# Altium schematic symbol library jlcpcb_2025_04_capacitors_extended_0603.schlib: 3668 symbols (part 5 of 20) (continued)
## 0603X225K250NT
designator C?  Capacitance: 2.2uF  (hidden comment: *)
Capacitor, Ceramic (MLCC), 2.2uF, ±10%, 25V, X5R, ±10%, SMD 0603; Manufacturer: FH(Guangdong Fenghua Advanced Tech); Manufacturer Part Number: 0603X225K250NT; Package Size: 0603; JLCPCB Basic Part: No; JLCPCB Part Number: C99227; Supplier 1: LCSC; Category: Capacitors - MLCC; Supplier Part Number 1: C99227; Tolerance: ±10%; Voltage Rating: 25V; Temperature Coefficient: X5R; RoHS: Yes; ComponentLink1Description: Datasheet; ComponentLink1URL: https://wmsc.lcsc.com/wmsc/upload/file/pdf/v2/lcsc/2304140030_FH--Guangdong-Fenghua-Advanced-Tech-0603X225K250NT_C99227.pdf; ComponentLink2Description: JLCPCB Part URL; ComponentLink2URL: https://jlcpcb.com/partdetail/C99227; ComponentLink3Description: LCSC Part URL; ComponentLink3URL: https://lcsc.com/product-detail/Multilayer-Ceramic-Capacitors-MLCC---SMD-SMT_FH-Guangdong-Fenghua-Advanced-Tech-FH-Guangdong-Fenghua-Advanced-Tech-0603X225K250NT_C99227.html
footprint CAP-0603 (0603 (1608M) Capacitor)
pins: 1, 2

## 0603X225K500CT
designator C?  Capacitance: 2.2uF  (hidden comment: *)
Capacitor, Ceramic (MLCC), 2.2uF, ±10%, 50V, X5R, ±10%, SMD 0603; Manufacturer: Walsin Tech Corp; Manufacturer Part Number: 0603X225K500CT; Package Size: 0603; JLCPCB Basic Part: No; JLCPCB Part Number: C3853330; Supplier 1: LCSC; Category: Capacitors - MLCC; Supplier Part Number 1: C3853330; Tolerance: ±10%; Voltage Rating: 50V; Temperature Coefficient: X5R; RoHS: Yes; ComponentLink1Description: Datasheet; ComponentLink1URL: https://wmsc.lcsc.com/wmsc/upload/file/pdf/v2/lcsc/2309201536_Walsin-Tech-Corp-0603X225K500CT_C3853330.pdf; ComponentLink2Description: JLCPCB Part URL; ComponentLink2URL: https://jlcpcb.com/partdetail/C3853330; ComponentLink3Description: LCSC Part URL; ComponentLink3URL: https://lcsc.com/product-detail/Multilayer-Ceramic-Capacitors-MLCC---SMD-SMT_Walsin-Tech-Corp-Walsin-Tech-Corp-0603X225K500CT_C3853330.html
footprint CAP-0603 (0603 (1608M) Capacitor)
pins: 1, 2

## 0603X225M6R3CT
designator C?  Capacitance: 2.2uF  (hidden comment: *)
Capacitor, Ceramic (MLCC), 2.2uF, ±20%, 6.3V, X5R, ±20%, SMD 0603; Manufacturer: Walsin Tech Corp; Manufacturer Part Number: 0603X225M6R3CT; Package Size: 0603; JLCPCB Basic Part: No; JLCPCB Part Number: C458915; Supplier 1: LCSC; Category: Capacitors - MLCC; Supplier Part Number 1: C458915; Tolerance: ±20%; Voltage Rating: 6.3V; Temperature Coefficient: X5R; RoHS: Yes; ComponentLink1Description: Datasheet; ComponentLink1URL: https://wmsc.lcsc.com/wmsc/upload/file/pdf/v2/lcsc/2304140030_Walsin-Tech-Corp-0603X225M6R3CT_C458915.pdf; ComponentLink2Description: JLCPCB Part URL; ComponentLink2URL: https://jlcpcb.com/partdetail/C458915; ComponentLink3Description: LCSC Part URL; ComponentLink3URL: https://lcsc.com/product-detail/Multilayer-Ceramic-Capacitors-MLCC---SMD-SMT_Walsin-Tech-Corp-Walsin-Tech-Corp-0603X225M6R3CT_C458915.html
footprint CAP-0603 (0603 (1608M) Capacitor)
pins: 1, 2

## 0603X225M100NT
designator C?  Capacitance: 2200000pF  (hidden comment: *)
Capacitor, Ceramic (MLCC), 2200000pF, ±20%, 10V, X5R, ±20%, SMD 0603; Manufacturer: FH (Guangdong Fenghua Advanced Tech); Manufacturer Part Number: 0603X225M100NT; Package Size: 0603; JLCPCB Basic Part: No; JLCPCB Part Number: C2857986; Supplier 1: LCSC; Category: Capacitors - MLCC; Supplier Part Number 1: C2857986; Tolerance: ±20%; Voltage Rating: 10V; Temperature Coefficient: X5R; RoHS: Yes; ComponentLink1Description: Datasheet; ComponentLink2Description: JLCPCB Part URL; ComponentLink2URL: https://jlcpcb.com/partdetail/C2857986; ComponentLink3Description: LCSC Part URL; ComponentLink3URL: https://lcsc.com/product-detail/Multilayer-Ceramic-Capacitors-MLCC---SMD-SMT_FH-Guangdong-Fenghua-Advanced-Tech-FH-Guangdong-Fenghua-Advanced-Tech-0603X225M100NT_C2857986.html
footprint CAP-0603 (0603 (1608M) Capacitor)
pins: 1, 2

## 0603X226M6R3CT
designator C?  Capacitance: 22uF  (hidden comment: *)
Capacitor, Ceramic (MLCC), 22uF, ±20%, 6.3V, X5R, ±20%, SMD 0603; Manufacturer: Walsin Tech Corp; Manufacturer Part Number: 0603X226M6R3CT; Package Size: 0603; JLCPCB Basic Part: No; JLCPCB Part Number: C93926; Supplier 1: LCSC; Category: Capacitors - MLCC; Supplier Part Number 1: C93926; Tolerance: ±20%; Voltage Rating: 6.3V; Temperature Coefficient: X5R; RoHS: Yes; ComponentLink1Description: Datasheet; ComponentLink1URL: https://wmsc.lcsc.com/wmsc/upload/file/pdf/v2/lcsc/2304140030_Walsin-Tech-Corp-0603X226M6R3CT_C93926.pdf; ComponentLink2Description: JLCPCB Part URL; ComponentLink2URL: https://jlcpcb.com/partdetail/C93926; ComponentLink3Description: LCSC Part URL; ComponentLink3URL: https://lcsc.com/product-detail/Multilayer-Ceramic-Capacitors-MLCC---SMD-SMT_Walsin-Tech-Corp-Walsin-Tech-Corp-0603X226M6R3CT_C93926.html
footprint CAP-0603 (0603 (1608M) Capacitor)
pins: 1, 2

## 0603X226M6R3NT
designator C?  Capacitance: 22uF  (hidden comment: *)
Capacitor, Ceramic (MLCC), 22uF, ±20%, 6.3V, X5R, ±20%, SMD 0603; Manufacturer: FH(Guangdong Fenghua Advanced Tech); Manufacturer Part Number: 0603X226M6R3NT; Package Size: 0603; JLCPCB Basic Part: No; JLCPCB Part Number: C94018; Supplier 1: LCSC; Category: Capacitors - MLCC; Supplier Part Number 1: C94018; Tolerance: ±20%; Voltage Rating: 6.3V; Temperature Coefficient: X5R; RoHS: Yes; ComponentLink1Description: Datasheet; ComponentLink1URL: https://wmsc.lcsc.com/wmsc/upload/file/pdf/v2/lcsc/2304140030_FH--Guangdong-Fenghua-Advanced-Tech-0603X226M6R3NT_C94018.pdf; ComponentLink2Description: JLCPCB Part URL; ComponentLink2URL: https://jlcpcb.com/partdetail/C94018; ComponentLink3Description: LCSC Part URL; ComponentLink3URL: https://lcsc.com/product-detail/Multilayer-Ceramic-Capacitors-MLCC---SMD-SMT_FH-Guangdong-Fenghua-Advanced-Tech-FH-Guangdong-Fenghua-Advanced-Tech-0603X226M6R3NT_C94018.html
footprint CAP-0603 (0603 (1608M) Capacitor)
pins: 1, 2

## 0603X226M100CT
designator C?  Capacitance: 22uF  (hidden comment: *)
Capacitor, Ceramic (MLCC), 22uF, ±20%, 10V, X5R, ±20%, SMD 0603; Manufacturer: Walsin Tech Corp; Manufacturer Part Number: 0603X226M100CT; Package Size: 0603; JLCPCB Basic Part: No; JLCPCB Part Number: C2992620; Supplier 1: LCSC; Category: Capacitors - MLCC; Supplier Part Number 1: C2992620; Tolerance: ±20%; Voltage Rating: 10V; Temperature Coefficient: X5R; RoHS: Yes; ComponentLink1Description: Datasheet; ComponentLink1URL: https://wmsc.lcsc.com/wmsc/upload/file/pdf/v2/lcsc/2204121445_Walsin-Tech-Corp-0603X226M100CT_C2992620.pdf; ComponentLink2Description: JLCPCB Part URL; ComponentLink2URL: https://jlcpcb.com/partdetail/C2992620; ComponentLink3Description: LCSC Part URL; ComponentLink3URL: https://lcsc.com/product-detail/Multilayer-Ceramic-Capacitors-MLCC---SMD-SMT_Walsin-Tech-Corp-Walsin-Tech-Corp-0603X226M100CT_C2992620.html
footprint CAP-0603 (0603 (1608M) Capacitor)
pins: 1, 2

## 0603X226M100NT_C60077
designator C?  Capacitance: 22uF  (hidden comment: *)
Capacitor, Ceramic (MLCC), 22uF, ±20%, 10V, X5R, ±20%, SMD 0603; Manufacturer: FH(Guangdong Fenghua Advanced Tech); Manufacturer Part Number: 0603X226M100NT; Package Size: 0603; JLCPCB Basic Part: No; JLCPCB Part Number: C60077; Supplier 1: LCSC; Category: Capacitors - MLCC; Supplier Part Number 1: C60077; Tolerance: ±20%; Voltage Rating: 10V; Temperature Coefficient: X5R; RoHS: Yes; ComponentLink1Description: Datasheet; ComponentLink1URL: https://wmsc.lcsc.com/wmsc/upload/file/pdf/v2/lcsc/2304140030_FH--Guangdong-Fenghua-Advanced-Tech-0603X226M100NT_C60077.pdf; ComponentLink2Description: JLCPCB Part URL; ComponentLink2URL: https://jlcpcb.com/partdetail/C60077; ComponentLink3Description: LCSC Part URL; ComponentLink3URL: https://lcsc.com/product-detail/Multilayer-Ceramic-Capacitors-MLCC---SMD-SMT_FH-Guangdong-Fenghua-Advanced-Tech-FH-Guangdong-Fenghua-Advanced-Tech-0603X226M100NT_C60077.html
footprint CAP-0603 (0603 (1608M) Capacitor)
pins: 1, 2

## 0603X226M100NT_C5181863
designator C?  Capacitance: 22uF  (hidden comment: *)
Capacitor, Ceramic (MLCC), 22uF, 10V, X5R, SMD 0603; Manufacturer: FH (Guangdong Fenghua Advanced Tech); Manufacturer Part Number: 0603X226M100NT; Package Size: 0603; JLCPCB Basic Part: No; JLCPCB Part Number: C5181863; Supplier 1: LCSC; Category: Capacitors - MLCC; Supplier Part Number 1: C5181863; Voltage Rating: 10V; Temperature Coefficient: X5R; RoHS: Yes; ComponentLink1Description: Datasheet; ComponentLink1URL: https://wmsc.lcsc.com/wmsc/upload/file/pdf/v2/lcsc/2209261730_FH--Guangdong-Fenghua-Advanced-Tech-0603X226M100NT_C5181863.pdf; ComponentLink2Description: JLCPCB Part URL; ComponentLink2URL: https://jlcpcb.com/partdetail/C5181863; ComponentLink3Description: LCSC Part URL; ComponentLink3URL: https://lcsc.com/product-detail/Multilayer-Ceramic-Capacitors-MLCC---SMD-SMT_FH-Guangdong-Fenghua-Advanced-Tech-FH-Guangdong-Fenghua-Advanced-Tech-0603X226M100NT_C5181863.html
footprint CAP-0603 (0603 (1608M) Capacitor)
pins: 1, 2

## 0603X334K100CT
designator C?  Capacitance: 330nF  (hidden comment: *)
Capacitor, Ceramic (MLCC), 330nF, ±10%, 10V, X5R, ±10%, SMD 0603; Manufacturer: Walsin Tech Corp; Manufacturer Part Number: 0603X334K100CT; Package Size: 0603; JLCPCB Basic Part: No; JLCPCB Part Number: C384773; Supplier 1: LCSC; Category: Capacitors - MLCC; Supplier Part Number 1: C384773; Tolerance: ±10%; Voltage Rating: 10V; Temperature Coefficient: X5R; RoHS: Yes; ComponentLink1Description: Datasheet; ComponentLink1URL: https://wmsc.lcsc.com/wmsc/upload/file/pdf/v2/lcsc/2304140030_Walsin-Tech-Corp-0603X334K100CT_C384773.pdf; ComponentLink2Description: JLCPCB Part URL; ComponentLink2URL: https://jlcpcb.com/partdetail/C384773; ComponentLink3Description: LCSC Part URL; ComponentLink3URL: https://lcsc.com/product-detail/Multilayer-Ceramic-Capacitors-MLCC---SMD-SMT_Walsin-Tech-Corp-Walsin-Tech-Corp-0603X334K100CT_C384773.html
footprint CAP-0603 (0603 (1608M) Capacitor)
pins: 1, 2

## 0603X334K160CT
designator C?  Capacitance: 330nF  (hidden comment: *)
Capacitor, Ceramic (MLCC), 330nF, ±10%, 16V, X5R, ±10%, SMD 0603; Manufacturer: Walsin Tech Corp; Manufacturer Part Number: 0603X334K160CT; Package Size: 0603; JLCPCB Basic Part: No; JLCPCB Part Number: C458916; Supplier 1: LCSC; Category: Capacitors - MLCC; Supplier Part Number 1: C458916; Tolerance: ±10%; Voltage Rating: 16V; Temperature Coefficient: X5R; RoHS: Yes; ComponentLink1Description: Datasheet; ComponentLink1URL: https://wmsc.lcsc.com/wmsc/upload/file/pdf/v2/lcsc/2304140030_Walsin-Tech-Corp-0603X334K160CT_C458916.pdf; ComponentLink2Description: JLCPCB Part URL; ComponentLink2URL: https://jlcpcb.com/partdetail/C458916; ComponentLink3Description: LCSC Part URL; ComponentLink3URL: https://lcsc.com/product-detail/Multilayer-Ceramic-Capacitors-MLCC---SMD-SMT_Walsin-Tech-Corp-Walsin-Tech-Corp-0603X334K160CT_C458916.html
footprint CAP-0603 (0603 (1608M) Capacitor)
pins: 1, 2

## 0603X334K250CT
designator C?  Capacitance: 330nF  (hidden comment: *)
Capacitor, Ceramic (MLCC), 330nF, ±10%, 25V, X5R, ±10%, SMD 0603; Manufacturer: Walsin Tech Corp; Manufacturer Part Number: 0603X334K250CT; Package Size: 0603; JLCPCB Basic Part: No; JLCPCB Part Number: C237211; Supplier 1: LCSC; Category: Capacitors - MLCC; Supplier Part Number 1: C237211; Tolerance: ±10%; Voltage Rating: 25V; Temperature Coefficient: X5R; RoHS: Yes; ComponentLink1Description: Datasheet; ComponentLink1URL: https://wmsc.lcsc.com/wmsc/upload/file/pdf/v2/lcsc/2304140030_Walsin-Tech-Corp-0603X334K250CT_C237211.pdf; ComponentLink2Description: JLCPCB Part URL; ComponentLink2URL: https://jlcpcb.com/partdetail/C237211; ComponentLink3Description: LCSC Part URL; ComponentLink3URL: https://lcsc.com/product-detail/Multilayer-Ceramic-Capacitors-MLCC---SMD-SMT_Walsin-Tech-Corp-Walsin-Tech-Corp-0603X334K250CT_C237211.html
footprint CAP-0603 (0603 (1608M) Capacitor)
pins: 1, 2

## 0603X335K100CT
designator C?  Capacitance: 3.3uF  (hidden comment: *)
Capacitor, Ceramic (MLCC), 3.3uF, ±10%, 10V, X5R, ±10%, SMD 0603; Manufacturer: Walsin Tech Corp; Manufacturer Part Number: 0603X335K100CT; Package Size: 0603; JLCPCB Basic Part: No; JLCPCB Part Number: C237213; Supplier 1: LCSC; Category: Capacitors - MLCC; Supplier Part Number 1: C237213; Tolerance: ±10%; Voltage Rating: 10V; Temperature Coefficient: X5R; RoHS: Yes; ComponentLink1Description: Datasheet; ComponentLink1URL: https://wmsc.lcsc.com/wmsc/upload/file/pdf/v2/lcsc/2304140030_Walsin-Tech-Corp-0603X335K100CT_C237213.pdf; ComponentLink2Description: JLCPCB Part URL; ComponentLink2URL: https://jlcpcb.com/partdetail/C237213; ComponentLink3Description: LCSC Part URL; ComponentLink3URL: https://lcsc.com/product-detail/Multilayer-Ceramic-Capacitors-MLCC---SMD-SMT_Walsin-Tech-Corp-Walsin-Tech-Corp-0603X335K100CT_C237213.html
footprint CAP-0603 (0603 (1608M) Capacitor)
pins: 1, 2

## 0603X474K100CT
designator C?  Capacitance: 470nF  (hidden comment: *)
Capacitor, Ceramic (MLCC), 470nF, ±10%, 10V, X5R, ±10%, SMD 0603; Manufacturer: Walsin Tech Corp; Manufacturer Part Number: 0603X474K100CT; Package Size: 0603; JLCPCB Basic Part: No; JLCPCB Part Number: C388026; Supplier 1: LCSC; Category: Capacitors - MLCC; Supplier Part Number 1: C388026; Tolerance: ±10%; Voltage Rating: 10V; Temperature Coefficient: X5R; RoHS: Yes; ComponentLink1Description: Datasheet; ComponentLink1URL: https://wmsc.lcsc.com/wmsc/upload/file/pdf/v2/lcsc/2304140030_Walsin-Tech-Corp-0603X474K100CT_C388026.pdf; ComponentLink2Description: JLCPCB Part URL; ComponentLink2URL: https://jlcpcb.com/partdetail/C388026; ComponentLink3Description: LCSC Part URL; ComponentLink3URL: https://lcsc.com/product-detail/Multilayer-Ceramic-Capacitors-MLCC---SMD-SMT_Walsin-Tech-Corp-Walsin-Tech-Corp-0603X474K100CT_C388026.html
footprint CAP-0603 (0603 (1608M) Capacitor)
pins: 1, 2

## 0603X474K100NT
designator C?  Capacitance: 470nF  (hidden comment: *)
Capacitor, Ceramic (MLCC), 470nF, 10V, SMD 0603; Manufacturer: FH (Guangdong Fenghua Advanced Tech); Manufacturer Part Number: 0603X474K100NT; Package Size: 0603; JLCPCB Basic Part: No; JLCPCB Part Number: C2894322; Supplier 1: LCSC; Category: Capacitors - MLCC; Supplier Part Number 1: C2894322; Voltage Rating: 10V; RoHS: Yes; ComponentLink1Description: Datasheet; ComponentLink1URL: https://wmsc.lcsc.com/wmsc/upload/file/pdf/v2/lcsc/2109100930_FH--Guangdong-Fenghua-Advanced-Tech-0603X474K100NT_C2894322.pdf; ComponentLink2Description: JLCPCB Part URL; ComponentLink2URL: https://jlcpcb.com/partdetail/C2894322; ComponentLink3Description: LCSC Part URL; ComponentLink3URL: https://lcsc.com/product-detail/Multilayer-Ceramic-Capacitors-MLCC---SMD-SMT_FH-Guangdong-Fenghua-Advanced-Tech-FH-Guangdong-Fenghua-Advanced-Tech-0603X474K100NT_C2894322.html
footprint CAP-0603 (0603 (1608M) Capacitor)
pins: 1, 2

## 0603X474K160CT
designator C?  Capacitance: 470nF  (hidden comment: *)
Capacitor, Ceramic (MLCC), 470nF, ±10%, 16V, X5R, ±10%, SMD 0603; Manufacturer: Walsin Tech Corp; Manufacturer Part Number: 0603X474K160CT; Package Size: 0603; JLCPCB Basic Part: No; JLCPCB Part Number: C424865; Supplier 1: LCSC; Category: Capacitors - MLCC; Supplier Part Number 1: C424865; Tolerance: ±10%; Voltage Rating: 16V; Temperature Coefficient: X5R; RoHS: Yes; ComponentLink1Description: Datasheet; ComponentLink1URL: https://wmsc.lcsc.com/wmsc/upload/file/pdf/v2/lcsc/2304140030_Walsin-Tech-Corp-0603X474K160CT_C424865.pdf; ComponentLink2Description: JLCPCB Part URL; ComponentLink2URL: https://jlcpcb.com/partdetail/C424865; ComponentLink3Description: LCSC Part URL; ComponentLink3URL: https://lcsc.com/product-detail/Multilayer-Ceramic-Capacitors-MLCC---SMD-SMT_Walsin-Tech-Corp-Walsin-Tech-Corp-0603X474K160CT_C424865.html
footprint CAP-0603 (0603 (1608M) Capacitor)
pins: 1, 2

## 0603X474K500CT
designator C?  Capacitance: 470nF  (hidden comment: *)
Capacitor, Ceramic (MLCC), 470nF, ±10%, 50V, X5R, ±10%, SMD 0603; Manufacturer: Walsin Tech Corp; Manufacturer Part Number: 0603X474K500CT; Package Size: 0603; JLCPCB Basic Part: No; JLCPCB Part Number: C388027; Supplier 1: LCSC; Category: Capacitors - MLCC; Supplier Part Number 1: C388027; Tolerance: ±10%; Voltage Rating: 50V; Temperature Coefficient: X5R; RoHS: Yes; ComponentLink1Description: Datasheet; ComponentLink1URL: https://wmsc.lcsc.com/wmsc/upload/file/pdf/v2/lcsc/2304140030_Walsin-Tech-Corp-0603X474K500CT_C388027.pdf; ComponentLink2Description: JLCPCB Part URL; ComponentLink2URL: https://jlcpcb.com/partdetail/C388027; ComponentLink3Description: LCSC Part URL; ComponentLink3URL: https://lcsc.com/product-detail/Multilayer-Ceramic-Capacitors-MLCC---SMD-SMT_Walsin-Tech-Corp-Walsin-Tech-Corp-0603X474K500CT_C388027.html
footprint CAP-0603 (0603 (1608M) Capacitor)
pins: 1, 2

## 0603X474K500NT
designator C?  Capacitance: 470nF  (hidden comment: *)
Capacitor, Ceramic (MLCC), 470nF, ±10%, 50V, X5R, ±10%, SMD 0603; Manufacturer: FH (Guangdong Fenghua Advanced Tech); Manufacturer Part Number: 0603X474K500NT; Package Size: 0603; JLCPCB Basic Part: No; JLCPCB Part Number: C5119970; Supplier 1: LCSC; Category: Capacitors - MLCC; Supplier Part Number 1: C5119970; Tolerance: ±10%; Voltage Rating: 50V; Temperature Coefficient: X5R; RoHS: Yes; ComponentLink1Description: Datasheet; ComponentLink1URL: https://wmsc.lcsc.com/wmsc/upload/file/pdf/v2/lcsc/2207221830_FH--Guangdong-Fenghua-Advanced-Tech-0603X474K500NT_C5119970.pdf; ComponentLink2Description: JLCPCB Part URL; ComponentLink2URL: https://jlcpcb.com/partdetail/C5119970; ComponentLink3Description: LCSC Part URL; ComponentLink3URL: https://lcsc.com/product-detail/Multilayer-Ceramic-Capacitors-MLCC---SMD-SMT_FH-Guangdong-Fenghua-Advanced-Tech-FH-Guangdong-Fenghua-Advanced-Tech-0603X474K500NT_C5119970.html
footprint CAP-0603 (0603 (1608M) Capacitor)
pins: 1, 2

## 0603X475K6R3CT
designator C?  Capacitance: 4.7uF  (hidden comment: *)
Capacitor, Ceramic (MLCC), 4.7uF, ±10%, 6.3V, X5R, ±10%, SMD 0603; Manufacturer: Walsin Tech Corp; Manufacturer Part Number: 0603X475K6R3CT; Package Size: 0603; JLCPCB Basic Part: No; JLCPCB Part Number: C388028; Supplier 1: LCSC; Category: Capacitors - MLCC; Supplier Part Number 1: C388028; Tolerance: ±10%; Voltage Rating: 6.3V; Temperature Coefficient: X5R; RoHS: Yes; ComponentLink1Description: Datasheet; ComponentLink1URL: https://wmsc.lcsc.com/wmsc/upload/file/pdf/v2/lcsc/2304140030_Walsin-Tech-Corp-0603X475K6R3CT_C388028.pdf; ComponentLink2Description: JLCPCB Part URL; ComponentLink2URL: https://jlcpcb.com/partdetail/C388028; ComponentLink3Description: LCSC Part URL; ComponentLink3URL: https://lcsc.com/product-detail/Multilayer-Ceramic-Capacitors-MLCC---SMD-SMT_Walsin-Tech-Corp-Walsin-Tech-Corp-0603X475K6R3CT_C388028.html
footprint CAP-0603 (0603 (1608M) Capacitor)
pins: 1, 2

## 0603X475K6R3NT
designator C?  Capacitance: 4.7uF  (hidden comment: *)
Capacitor, Ceramic (MLCC), 4.7uF, ±10%, 6.3V, X5R, ±10%, SMD 0603; Manufacturer: FH (Guangdong Fenghua Advanced Tech); Manufacturer Part Number: 0603X475K6R3NT; Package Size: 0603; JLCPCB Basic Part: No; JLCPCB Part Number: C913906; Supplier 1: LCSC; Category: Capacitors - MLCC; Supplier Part Number 1: C913906; Tolerance: ±10%; Voltage Rating: 6.3V; Temperature Coefficient: X5R; RoHS: Yes; ComponentLink1Description: Datasheet; ComponentLink1URL: https://wmsc.lcsc.com/wmsc/upload/file/pdf/v2/lcsc/2304140030_FH--Guangdong-Fenghua-Advanced-Tech-0603X475K6R3NT_C913906.pdf; ComponentLink2Description: JLCPCB Part URL; ComponentLink2URL: https://jlcpcb.com/partdetail/C913906; ComponentLink3Description: LCSC Part URL; ComponentLink3URL: https://lcsc.com/product-detail/Multilayer-Ceramic-Capacitors-MLCC---SMD-SMT_FH-Guangdong-Fenghua-Advanced-Tech-FH-Guangdong-Fenghua-Advanced-Tech-0603X475K6R3NT_C913906.html
footprint CAP-0603 (0603 (1608M) Capacitor)
pins: 1, 2

## 0603X475K100CT
designator C?  Capacitance: 4.7uF  (hidden comment: *)
Capacitor, Ceramic (MLCC), 4.7uF, ±10%, 10V, X5R, ±10%, SMD 0603; Manufacturer: Walsin Tech Corp; Manufacturer Part Number: 0603X475K100CT; Package Size: 0603; JLCPCB Basic Part: No; JLCPCB Part Number: C123611; Supplier 1: LCSC; Category: Capacitors - MLCC; Supplier Part Number 1: C123611; Tolerance: ±10%; Voltage Rating: 10V; Temperature Coefficient: X5R; RoHS: Yes; ComponentLink1Description: Datasheet; ComponentLink1URL: https://wmsc.lcsc.com/wmsc/upload/file/pdf/v2/lcsc/2304140030_Walsin-Tech-Corp-0603X475K100CT_C123611.pdf; ComponentLink2Description: JLCPCB Part URL; ComponentLink2URL: https://jlcpcb.com/partdetail/C123611; ComponentLink3Description: LCSC Part URL; ComponentLink3URL: https://lcsc.com/product-detail/Multilayer-Ceramic-Capacitors-MLCC---SMD-SMT_Walsin-Tech-Corp-Walsin-Tech-Corp-0603X475K100CT_C123611.html
footprint CAP-0603 (0603 (1608M) Capacitor)
pins: 1, 2

## 0603X475K100NT
designator C?  Capacitance: 4.7uF  (hidden comment: *)
Capacitor, Ceramic (MLCC), 4.7uF, ±10%, 10V, X5R, ±10%, SMD 0603; Manufacturer: FH(Guangdong Fenghua Advanced Tech); Manufacturer Part Number: 0603X475K100NT; Package Size: 0603; JLCPCB Basic Part: No; JLCPCB Part Number: C69182; Supplier 1: LCSC; Category: Capacitors - MLCC; Supplier Part Number 1: C69182; Tolerance: ±10%; Voltage Rating: 10V; Temperature Coefficient: X5R; RoHS: Yes; ComponentLink1Description: Datasheet; ComponentLink1URL: https://wmsc.lcsc.com/wmsc/upload/file/pdf/v2/lcsc/2304140030_FH--Guangdong-Fenghua-Advanced-Tech-0603X475K100NT_C69182.pdf; ComponentLink2Description: JLCPCB Part URL; ComponentLink2URL: https://jlcpcb.com/partdetail/C69182; ComponentLink3Description: LCSC Part URL; ComponentLink3URL: https://lcsc.com/product-detail/Multilayer-Ceramic-Capacitors-MLCC---SMD-SMT_FH-Guangdong-Fenghua-Advanced-Tech-FH-Guangdong-Fenghua-Advanced-Tech-0603X475K100NT_C69182.html
footprint CAP-0603 (0603 (1608M) Capacitor)
pins: 1, 2

## 0603X475K160CT
designator C?  Capacitance: 4.7uF  (hidden comment: *)
Capacitor, Ceramic (MLCC), 4.7uF, ±10%, 16V, X5R, ±10%, SMD 0603; Manufacturer: Walsin Tech Corp; Manufacturer Part Number: 0603X475K160CT; Package Size: 0603; JLCPCB Basic Part: No; JLCPCB Part Number: C296042; Supplier 1: LCSC; Category: Capacitors - MLCC; Supplier Part Number 1: C296042; Tolerance: ±10%; Voltage Rating: 16V; Temperature Coefficient: X5R; RoHS: Yes; ComponentLink1Description: Datasheet; ComponentLink1URL: https://wmsc.lcsc.com/wmsc/upload/file/pdf/v2/lcsc/2304140030_Walsin-Tech-Corp-0603X475K160CT_C296042.pdf; ComponentLink2Description: JLCPCB Part URL; ComponentLink2URL: https://jlcpcb.com/partdetail/C296042; ComponentLink3Description: LCSC Part URL; ComponentLink3URL: https://lcsc.com/product-detail/Multilayer-Ceramic-Capacitors-MLCC---SMD-SMT_Walsin-Tech-Corp-Walsin-Tech-Corp-0603X475K160CT_C296042.html
footprint CAP-0603 (0603 (1608M) Capacitor)
pins: 1, 2

## 0603X475K160NT
designator C?  Capacitance: 4.7uF  (hidden comment: *)
Capacitor, Ceramic (MLCC), 4.7uF, ±10%, 16V, X5R, ±10%, SMD 0603; Manufacturer: FH(Guangdong Fenghua Advanced Tech); Manufacturer Part Number: 0603X475K160NT; Package Size: 0603; JLCPCB Basic Part: No; JLCPCB Part Number: C99229; Supplier 1: LCSC; Category: Capacitors - MLCC; Supplier Part Number 1: C99229; Tolerance: ±10%; Voltage Rating: 16V; Temperature Coefficient: X5R; RoHS: Yes; ComponentLink1Description: Datasheet; ComponentLink1URL: https://wmsc.lcsc.com/wmsc/upload/file/pdf/v2/lcsc/2304140030_FH--Guangdong-Fenghua-Advanced-Tech-0603X475K160NT_C99229.pdf; ComponentLink2Description: JLCPCB Part URL; ComponentLink2URL: https://jlcpcb.com/partdetail/C99229; ComponentLink3Description: LCSC Part URL; ComponentLink3URL: https://lcsc.com/product-detail/Multilayer-Ceramic-Capacitors-MLCC---SMD-SMT_FH-Guangdong-Fenghua-Advanced-Tech-FH-Guangdong-Fenghua-Advanced-Tech-0603X475K160NT_C99229.html
footprint CAP-0603 (0603 (1608M) Capacitor)
pins: 1, 2

## 0603X475K250
designator C?  Capacitance: 4.7uF  (hidden comment: *)
Capacitor, Ceramic (MLCC), 4.7uF, ±10%, 25V, X5R, ±10%, SMD 0603; Manufacturer: Walsin Tech Corp; Manufacturer Part Number: 0603X475K250; Package Size: 0603; JLCPCB Basic Part: No; JLCPCB Part Number: C152896; Supplier 1: LCSC; Category: Capacitors - MLCC; Supplier Part Number 1: C152896; Tolerance: ±10%; Voltage Rating: 25V; Temperature Coefficient: X5R; RoHS: Yes; ComponentLink1Description: Datasheet; ComponentLink1URL: https://wmsc.lcsc.com/wmsc/upload/file/pdf/v2/lcsc/2304140030_Walsin-Tech-Corp-0603X475K250_C152896.pdf; ComponentLink2Description: JLCPCB Part URL; ComponentLink2URL: https://jlcpcb.com/partdetail/C152896; ComponentLink3Description: LCSC Part URL; ComponentLink3URL: https://lcsc.com/product-detail/Multilayer-Ceramic-Capacitors-MLCC---SMD-SMT_Walsin-Tech-Corp-Walsin-Tech-Corp-0603X475K250_C152896.html
footprint CAP-0603 (0603 (1608M) Capacitor)
pins: 1, 2

## 0603X475K250CT
designator C?  Capacitance: 4.7uF  (hidden comment: *)
Capacitor, Ceramic (MLCC), 4.7uF, ±10%, 25V, X5R, ±10%, SMD 0603; Manufacturer: Walsin Tech Corp; Manufacturer Part Number: 0603X475K250CT; Package Size: 0603; JLCPCB Basic Part: No; JLCPCB Part Number: C2992628; Supplier 1: LCSC; Category: Capacitors - MLCC; Supplier Part Number 1: C2992628; Tolerance: ±10%; Voltage Rating: 25V; Temperature Coefficient: X5R; RoHS: Yes; ComponentLink1Description: Datasheet; ComponentLink1URL: https://wmsc.lcsc.com/wmsc/upload/file/pdf/v2/lcsc/2204121445_Walsin-Tech-Corp-0603X475K250CT_C2992628.pdf; ComponentLink2Description: JLCPCB Part URL; ComponentLink2URL: https://jlcpcb.com/partdetail/C2992628; ComponentLink3Description: LCSC Part URL; ComponentLink3URL: https://lcsc.com/product-detail/Multilayer-Ceramic-Capacitors-MLCC---SMD-SMT_Walsin-Tech-Corp-Walsin-Tech-Corp-0603X475K250CT_C2992628.html
footprint CAP-0603 (0603 (1608M) Capacitor)
pins: 1, 2

## 0603X475K250NT
designator C?  Capacitance: 4.7uF  (hidden comment: *)
Capacitor, Ceramic (MLCC), 4.7uF, ±10%, 25V, X5R, ±10%, SMD 0603; Manufacturer: FH(Guangdong Fenghua Advanced Tech); Manufacturer Part Number: 0603X475K250NT; Package Size: 0603; JLCPCB Basic Part: No; JLCPCB Part Number: C2936640; Supplier 1: LCSC; Category: Capacitors - MLCC; Supplier Part Number 1: C2936640; Tolerance: ±10%; Voltage Rating: 25V; Temperature Coefficient: X5R; RoHS: Yes; ComponentLink1Description: Datasheet; ComponentLink1URL: https://wmsc.lcsc.com/wmsc/upload/file/pdf/v2/lcsc/2201121730_FH--Guangdong-Fenghua-Advanced-Tech-0603X475K250NT_C2936640.pdf; ComponentLink2Description: JLCPCB Part URL; ComponentLink2URL: https://jlcpcb.com/partdetail/C2936640; ComponentLink3Description: LCSC Part URL; ComponentLink3URL: https://lcsc.com/product-detail/Multilayer-Ceramic-Capacitors-MLCC---SMD-SMT_FH-Guangdong-Fenghua-Advanced-Tech-FH-Guangdong-Fenghua-Advanced-Tech-0603X475K250NT_C2936640.html
footprint CAP-0603 (0603 (1608M) Capacitor)
pins: 1, 2

## 0603X475M6R3CT
designator C?  Capacitance: 4.7uF  (hidden comment: *)
Capacitor, Ceramic (MLCC), 4.7uF, ±20%, 6.3V, X5R, ±20%, SMD 0603; Manufacturer: Walsin Tech Corp; Manufacturer Part Number: 0603X475M6R3CT; Package Size: 0603; JLCPCB Basic Part: No; JLCPCB Part Number: C388029; Supplier 1: LCSC; Category: Capacitors - MLCC; Supplier Part Number 1: C388029; Tolerance: ±20%; Voltage Rating: 6.3V; Temperature Coefficient: X5R; RoHS: Yes; ComponentLink1Description: Datasheet; ComponentLink1URL: https://wmsc.lcsc.com/wmsc/upload/file/pdf/v2/lcsc/2304140030_Walsin-Tech-Corp-0603X475M6R3CT_C388029.pdf; ComponentLink2Description: JLCPCB Part URL; ComponentLink2URL: https://jlcpcb.com/partdetail/C388029; ComponentLink3Description: LCSC Part URL; ComponentLink3URL: https://lcsc.com/product-detail/Multilayer-Ceramic-Capacitors-MLCC---SMD-SMT_Walsin-Tech-Corp-Walsin-Tech-Corp-0603X475M6R3CT_C388029.html
footprint CAP-0603 (0603 (1608M) Capacitor)
pins: 1, 2

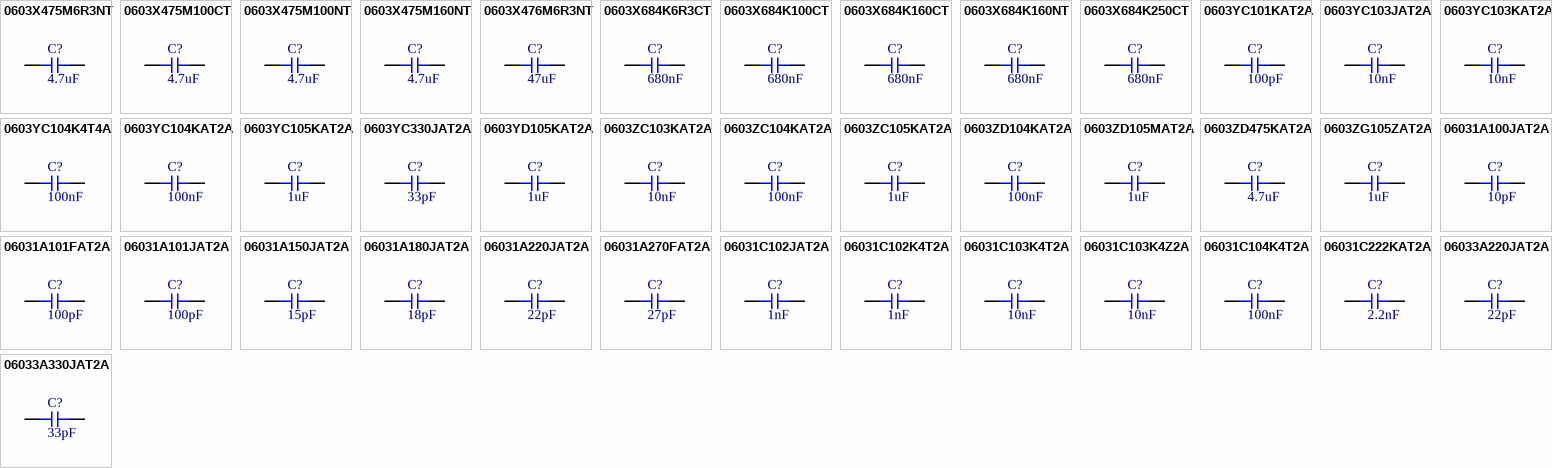
[diagram p21: symbols 0603X475M6R3NT to 06033A330JAT2A]

## 0603X475M6R3NT
designator C?  Capacitance: 4.7uF  (hidden comment: *)
Capacitor, Ceramic (MLCC), 4.7uF, ±20%, 6.3V, X5R, ±20%, SMD 0603; Manufacturer: FH(Guangdong Fenghua Advanced Tech); Manufacturer Part Number: 0603X475M6R3NT; Package Size: 0603; JLCPCB Basic Part: No; JLCPCB Part Number: C167655; Supplier 1: LCSC; Category: Capacitors - MLCC; Supplier Part Number 1: C167655; Tolerance: ±20%; Voltage Rating: 6.3V; Temperature Coefficient: X5R; RoHS: Yes; ComponentLink1Description: Datasheet; ComponentLink1URL: https://wmsc.lcsc.com/wmsc/upload/file/pdf/v2/lcsc/2304140030_FH--Guangdong-Fenghua-Advanced-Tech-0603X475M6R3NT_C167655.pdf; ComponentLink2Description: JLCPCB Part URL; ComponentLink2URL: https://jlcpcb.com/partdetail/C167655; ComponentLink3Description: LCSC Part URL; ComponentLink3URL: https://lcsc.com/product-detail/Multilayer-Ceramic-Capacitors-MLCC---SMD-SMT_FH-Guangdong-Fenghua-Advanced-Tech-FH-Guangdong-Fenghua-Advanced-Tech-0603X475M6R3NT_C167655.html
footprint CAP-0603 (0603 (1608M) Capacitor)
pins: 1, 2

## 0603X475M100CT
designator C?  Capacitance: 4.7uF  (hidden comment: *)
Capacitor, Ceramic (MLCC), 4.7uF, ±20%, 10V, X5R, ±20%, SMD 0603; Manufacturer: Walsin Tech Corp; Manufacturer Part Number: 0603X475M100CT; Package Size: 0603; JLCPCB Basic Part: No; JLCPCB Part Number: C458917; Supplier 1: LCSC; Category: Capacitors - MLCC; Supplier Part Number 1: C458917; Tolerance: ±20%; Voltage Rating: 10V; Temperature Coefficient: X5R; RoHS: Yes; ComponentLink1Description: Datasheet; ComponentLink1URL: https://wmsc.lcsc.com/wmsc/upload/file/pdf/v2/lcsc/2304140030_Walsin-Tech-Corp-0603X475M100CT_C458917.pdf; ComponentLink2Description: JLCPCB Part URL; ComponentLink2URL: https://jlcpcb.com/partdetail/C458917; ComponentLink3Description: LCSC Part URL; ComponentLink3URL: https://lcsc.com/product-detail/Multilayer-Ceramic-Capacitors-MLCC---SMD-SMT_Walsin-Tech-Corp-Walsin-Tech-Corp-0603X475M100CT_C458917.html
footprint CAP-0603 (0603 (1608M) Capacitor)
pins: 1, 2

## 0603X475M100NT
designator C?  Capacitance: 4.7uF  (hidden comment: *)
Capacitor, Ceramic (MLCC), 4.7uF, ±20%, 10V, X5R, ±20%, SMD 0603; Manufacturer: FH (Guangdong Fenghua Advanced Tech); Manufacturer Part Number: 0603X475M100NT; Package Size: 0603; JLCPCB Basic Part: No; JLCPCB Part Number: C2857987; Supplier 1: LCSC; Category: Capacitors - MLCC; Supplier Part Number 1: C2857987; Tolerance: ±20%; Voltage Rating: 10V; Temperature Coefficient: X5R; RoHS: Yes; ComponentLink1Description: Datasheet; ComponentLink1URL: https://wmsc.lcsc.com/wmsc/upload/file/pdf/v2/lcsc/2401231443_FH--Guangdong-Fenghua-Advanced-Tech-0603X475M100NT_C2857987.pdf; ComponentLink2Description: JLCPCB Part URL; ComponentLink2URL: https://jlcpcb.com/partdetail/C2857987; ComponentLink3Description: LCSC Part URL; ComponentLink3URL: https://lcsc.com/product-detail/Multilayer-Ceramic-Capacitors-MLCC---SMD-SMT_FH-Guangdong-Fenghua-Advanced-Tech-FH-Guangdong-Fenghua-Advanced-Tech-0603X475M100NT_C2857987.html
footprint CAP-0603 (0603 (1608M) Capacitor)
pins: 1, 2

## 0603X475M160NT
designator C?  Capacitance: 4.7uF  (hidden comment: *)
Capacitor, Ceramic (MLCC), 4.7uF, ±20%, 16V, X5R, ±20%, SMD 0603; Manufacturer: FH(Guangdong Fenghua Advanced Tech); Manufacturer Part Number: 0603X475M160NT; Package Size: 0603; JLCPCB Basic Part: No; JLCPCB Part Number: C417282; Supplier 1: LCSC; Category: Capacitors - MLCC; Supplier Part Number 1: C417282; Tolerance: ±20%; Voltage Rating: 16V; Temperature Coefficient: X5R; RoHS: Yes; ComponentLink1Description: Datasheet; ComponentLink1URL: https://wmsc.lcsc.com/wmsc/upload/file/pdf/v2/lcsc/1912111437_FH--Guangdong-Fenghua-Advanced-Tech-0603X475M160NT_C417282.pdf; ComponentLink2Description: JLCPCB Part URL; ComponentLink2URL: https://jlcpcb.com/partdetail/C417282; ComponentLink3Description: LCSC Part URL; ComponentLink3URL: https://lcsc.com/product-detail/Multilayer-Ceramic-Capacitors-MLCC---SMD-SMT_FH-Guangdong-Fenghua-Advanced-Tech-FH-Guangdong-Fenghua-Advanced-Tech-0603X475M160NT_C417282.html
footprint CAP-0603 (0603 (1608M) Capacitor)
pins: 1, 2

## 0603X476M6R3NT
designator C?  Capacitance: 47uF  (hidden comment: *)
Capacitor, Ceramic (MLCC), 47uF, ±20%, 6.3V, X5R, ±20%, SMD 0603; Manufacturer: FH(Guangdong Fenghua Advanced Tech); Manufacturer Part Number: 0603X476M6R3NT; Package Size: 0603; JLCPCB Basic Part: No; JLCPCB Part Number: C178330; Supplier 1: LCSC; Category: Capacitors - MLCC; Supplier Part Number 1: C178330; Tolerance: ±20%; Voltage Rating: 6.3V; Temperature Coefficient: X5R; RoHS: Yes; ComponentLink1Description: Datasheet; ComponentLink1URL: https://wmsc.lcsc.com/wmsc/upload/file/pdf/v2/lcsc/2304140030_FH--Guangdong-Fenghua-Advanced-Tech-0603X476M6R3NT_C178330.pdf; ComponentLink2Description: JLCPCB Part URL; ComponentLink2URL: https://jlcpcb.com/partdetail/C178330; ComponentLink3Description: LCSC Part URL; ComponentLink3URL: https://lcsc.com/product-detail/Multilayer-Ceramic-Capacitors-MLCC---SMD-SMT_FH-Guangdong-Fenghua-Advanced-Tech-FH-Guangdong-Fenghua-Advanced-Tech-0603X476M6R3NT_C178330.html
footprint CAP-0603 (0603 (1608M) Capacitor)
pins: 1, 2

## 0603X684K6R3CT
designator C?  Capacitance: 680nF  (hidden comment: *)
Capacitor, Ceramic (MLCC), 680nF, ±10%, 6.3V, X5R, ±10%, SMD 0603; Manufacturer: Walsin Tech Corp; Manufacturer Part Number: 0603X684K6R3CT; Package Size: 0603; JLCPCB Basic Part: No; JLCPCB Part Number: C469639; Supplier 1: LCSC; Category: Capacitors - MLCC; Supplier Part Number 1: C469639; Tolerance: ±10%; Voltage Rating: 6.3V; Temperature Coefficient: X5R; RoHS: Yes; ComponentLink1Description: Datasheet; ComponentLink1URL: https://wmsc.lcsc.com/wmsc/upload/file/pdf/v2/lcsc/2304140030_Walsin-Tech-Corp-0603X684K6R3CT_C469639.pdf; ComponentLink2Description: JLCPCB Part URL; ComponentLink2URL: https://jlcpcb.com/partdetail/C469639; ComponentLink3Description: LCSC Part URL; ComponentLink3URL: https://lcsc.com/product-detail/Multilayer-Ceramic-Capacitors-MLCC---SMD-SMT_Walsin-Tech-Corp-Walsin-Tech-Corp-0603X684K6R3CT_C469639.html
footprint CAP-0603 (0603 (1608M) Capacitor)
pins: 1, 2

## 0603X684K100CT
designator C?  Capacitance: 680nF  (hidden comment: *)
Capacitor, Ceramic (MLCC), 680nF, ±10%, 10V, X5R, ±10%, SMD 0603; Manufacturer: Walsin Tech Corp; Manufacturer Part Number: 0603X684K100CT; Package Size: 0603; JLCPCB Basic Part: No; JLCPCB Part Number: C303887; Supplier 1: LCSC; Category: Capacitors - MLCC; Supplier Part Number 1: C303887; Tolerance: ±10%; Voltage Rating: 10V; Temperature Coefficient: X5R; RoHS: Yes; ComponentLink1Description: Datasheet; ComponentLink1URL: https://wmsc.lcsc.com/wmsc/upload/file/pdf/v2/lcsc/2304140030_Walsin-Tech-Corp-0603X684K100CT_C303887.pdf; ComponentLink2Description: JLCPCB Part URL; ComponentLink2URL: https://jlcpcb.com/partdetail/C303887; ComponentLink3Description: LCSC Part URL; ComponentLink3URL: https://lcsc.com/product-detail/Multilayer-Ceramic-Capacitors-MLCC---SMD-SMT_Walsin-Tech-Corp-Walsin-Tech-Corp-0603X684K100CT_C303887.html
footprint CAP-0603 (0603 (1608M) Capacitor)
pins: 1, 2

## 0603X684K160CT
designator C?  Capacitance: 680nF  (hidden comment: *)
Capacitor, Ceramic (MLCC), 680nF, ±10%, 16V, X5R, ±10%, SMD 0603; Manufacturer: Walsin Tech Corp; Manufacturer Part Number: 0603X684K160CT; Package Size: 0603; JLCPCB Basic Part: No; JLCPCB Part Number: C152895; Supplier 1: LCSC; Category: Capacitors - MLCC; Supplier Part Number 1: C152895; Tolerance: ±10%; Voltage Rating: 16V; Temperature Coefficient: X5R; RoHS: Yes; ComponentLink1Description: Datasheet; ComponentLink1URL: https://wmsc.lcsc.com/wmsc/upload/file/pdf/v2/lcsc/2304140030_Walsin-Tech-Corp-0603X684K160CT_C152895.pdf; ComponentLink2Description: JLCPCB Part URL; ComponentLink2URL: https://jlcpcb.com/partdetail/C152895; ComponentLink3Description: LCSC Part URL; ComponentLink3URL: https://lcsc.com/product-detail/Multilayer-Ceramic-Capacitors-MLCC---SMD-SMT_Walsin-Tech-Corp-Walsin-Tech-Corp-0603X684K160CT_C152895.html
footprint CAP-0603 (0603 (1608M) Capacitor)
pins: 1, 2

## 0603X684K160NT
designator C?  Capacitance: 680nF  (hidden comment: *)
Capacitor, Ceramic (MLCC), 680nF, ±10%, 16V, ±10%, SMD 0603; Manufacturer: FH(Guangdong Fenghua Advanced Tech); Manufacturer Part Number: 0603X684K160NT; Package Size: 0603; JLCPCB Basic Part: No; JLCPCB Part Number: C1322366; Supplier 1: LCSC; Category: Capacitors - MLCC; Supplier Part Number 1: C1322366; Tolerance: ±10%; Voltage Rating: 16V; RoHS: Yes; ComponentLink1Description: Datasheet; ComponentLink1URL: https://wmsc.lcsc.com/wmsc/upload/file/pdf/v2/lcsc/2304140030_FH--Guangdong-Fenghua-Advanced-Tech-0603X684K160NT_C1322366.pdf; ComponentLink2Description: JLCPCB Part URL; ComponentLink2URL: https://jlcpcb.com/partdetail/C1322366; ComponentLink3Description: LCSC Part URL; ComponentLink3URL: https://lcsc.com/product-detail/Multilayer-Ceramic-Capacitors-MLCC---SMD-SMT_FH-Guangdong-Fenghua-Advanced-Tech-FH-Guangdong-Fenghua-Advanced-Tech-0603X684K160NT_C1322366.html
footprint CAP-0603 (0603 (1608M) Capacitor)
pins: 1, 2

## 0603X684K250CT
designator C?  Capacitance: 680nF  (hidden comment: *)
Capacitor, Ceramic (MLCC), 680nF, ±10%, 25V, X5R, ±10%, SMD 0603; Manufacturer: Walsin Tech Corp; Manufacturer Part Number: 0603X684K250CT; Package Size: 0603; JLCPCB Basic Part: No; JLCPCB Part Number: C303888; Supplier 1: LCSC; Category: Capacitors - MLCC; Supplier Part Number 1: C303888; Tolerance: ±10%; Voltage Rating: 25V; Temperature Coefficient: X5R; RoHS: Yes; ComponentLink1Description: Datasheet; ComponentLink1URL: https://wmsc.lcsc.com/wmsc/upload/file/pdf/v2/lcsc/2304140030_Walsin-Tech-Corp-0603X684K250CT_C303888.pdf; ComponentLink2Description: JLCPCB Part URL; ComponentLink2URL: https://jlcpcb.com/partdetail/C303888; ComponentLink3Description: LCSC Part URL; ComponentLink3URL: https://lcsc.com/product-detail/Multilayer-Ceramic-Capacitors-MLCC---SMD-SMT_Walsin-Tech-Corp-Walsin-Tech-Corp-0603X684K250CT_C303888.html
footprint CAP-0603 (0603 (1608M) Capacitor)
pins: 1, 2

## 0603YC101KAT2A
designator C?  Capacitance: 100pF  (hidden comment: *)
Capacitor, Ceramic (MLCC), 100pF, ±10%, 16V, X7R, ±10%, SMD 0603; Manufacturer: Kyocera AVX; Manufacturer Part Number: 0603YC101KAT2A; Package Size: 0603; JLCPCB Basic Part: No; JLCPCB Part Number: C2169292; Supplier 1: LCSC; Category: Capacitors - MLCC; Supplier Part Number 1: C2169292; Tolerance: ±10%; Voltage Rating: 16V; Temperature Coefficient: X7R; RoHS: Yes; ComponentLink1Description: Datasheet; ComponentLink1URL: https://wmsc.lcsc.com/wmsc/upload/file/pdf/v2/lcsc/2304140030_Kyocera-AVX-0603YC101KAT2A_C2169292.pdf; ComponentLink2Description: JLCPCB Part URL; ComponentLink2URL: https://jlcpcb.com/partdetail/C2169292; ComponentLink3Description: LCSC Part URL; ComponentLink3URL: https://lcsc.com/product-detail/Multilayer-Ceramic-Capacitors-MLCC---SMD-SMT_Kyocera-AVX-Kyocera-AVX-0603YC101KAT2A_C2169292.html
footprint CAP-0603 (0603 (1608M) Capacitor)
pins: 1, 2

## 0603YC103JAT2A
designator C?  Capacitance: 10nF  (hidden comment: *)
Capacitor, Ceramic (MLCC), 10nF, ±5%, 16V, X7R, ±5%, SMD 0603; Manufacturer: Kyocera AVX; Manufacturer Part Number: 0603YC103JAT2A; Package Size: 0603; JLCPCB Basic Part: No; JLCPCB Part Number: C2168864; Supplier 1: LCSC; Category: Capacitors - MLCC; Supplier Part Number 1: C2168864; Tolerance: ±5%; Voltage Rating: 16V; Temperature Coefficient: X7R; RoHS: Yes; ComponentLink1Description: Datasheet; ComponentLink1URL: https://wmsc.lcsc.com/wmsc/upload/file/pdf/v2/lcsc/2304140030_Kyocera-AVX-0603YC103JAT2A_C2168864.pdf; ComponentLink2Description: JLCPCB Part URL; ComponentLink2URL: https://jlcpcb.com/partdetail/C2168864; ComponentLink3Description: LCSC Part URL; ComponentLink3URL: https://lcsc.com/product-detail/Multilayer-Ceramic-Capacitors-MLCC---SMD-SMT_Kyocera-AVX-Kyocera-AVX-0603YC103JAT2A_C2168864.html
footprint CAP-0603 (0603 (1608M) Capacitor)
pins: 1, 2

## 0603YC103KAT2A
designator C?  Capacitance: 10nF  (hidden comment: *)
Capacitor, Ceramic (MLCC), 10nF, ±10%, 16V, X7R, ±10%, SMD 0603; Manufacturer: AVX; Manufacturer Part Number: 0603YC103KAT2A; Package Size: 0603; JLCPCB Basic Part: No; JLCPCB Part Number: C597236; Supplier 1: LCSC; Category: Capacitors - MLCC; Supplier Part Number 1: C597236; Tolerance: ±10%; Voltage Rating: 16V; Temperature Coefficient: X7R; RoHS: Yes; ComponentLink1Description: Datasheet; ComponentLink1URL: https://wmsc.lcsc.com/wmsc/upload/file/pdf/v2/lcsc/2304140030_Kyocera-AVX-0603YC103KAT2A_C597236.pdf; ComponentLink2Description: JLCPCB Part URL; ComponentLink2URL: https://jlcpcb.com/partdetail/C597236; ComponentLink3Description: LCSC Part URL; ComponentLink3URL: https://lcsc.com/product-detail/Multilayer-Ceramic-Capacitors-MLCC---SMD-SMT_Kyocera-AVX-Kyocera-AVX-0603YC103KAT2A_C597236.html
footprint CAP-0603 (0603 (1608M) Capacitor)
pins: 1, 2

## 0603YC104K4T4A
designator C?  Capacitance: 100nF  (hidden comment: *)
Capacitor, Ceramic (MLCC), 100nF, ±10%, 16V, X7R, ±10%, SMD 0603; Manufacturer: Kyocera AVX; Manufacturer Part Number: 0603YC104K4T4A; Package Size: 0603; JLCPCB Basic Part: No; JLCPCB Part Number: C2171593; Supplier 1: LCSC; Category: Capacitors - MLCC; Supplier Part Number 1: C2171593; Tolerance: ±10%; Voltage Rating: 16V; Temperature Coefficient: X7R; RoHS: Yes; ComponentLink1Description: Datasheet; ComponentLink1URL: https://wmsc.lcsc.com/wmsc/upload/file/pdf/v2/lcsc/2304140030_Kyocera-AVX-0603YC104K4T4A_C2171593.pdf; ComponentLink2Description: JLCPCB Part URL; ComponentLink2URL: https://jlcpcb.com/partdetail/C2171593; ComponentLink3Description: LCSC Part URL; ComponentLink3URL: https://lcsc.com/product-detail/Multilayer-Ceramic-Capacitors-MLCC---SMD-SMT_Kyocera-AVX-Kyocera-AVX-0603YC104K4T4A_C2171593.html
footprint CAP-0603 (0603 (1608M) Capacitor)
pins: 1, 2

## 0603YC104KAT2A
designator C?  Capacitance: 100nF  (hidden comment: *)
Capacitor, Ceramic (MLCC), 100nF, ±10%, 16V, X7R, ±10%, SMD 0603; Manufacturer: AVX; Manufacturer Part Number: 0603YC104KAT2A; Package Size: 0603; JLCPCB Basic Part: No; JLCPCB Part Number: C130268; Supplier 1: LCSC; Category: Capacitors - MLCC; Supplier Part Number 1: C130268; Tolerance: ±10%; Voltage Rating: 16V; Temperature Coefficient: X7R; RoHS: Yes; ComponentLink1Description: Datasheet; ComponentLink1URL: https://wmsc.lcsc.com/wmsc/upload/file/pdf/v2/lcsc/2304140030_Kyocera-AVX-0603YC104KAT2A_C130268.pdf; ComponentLink2Description: JLCPCB Part URL; ComponentLink2URL: https://jlcpcb.com/partdetail/C130268; ComponentLink3Description: LCSC Part URL; ComponentLink3URL: https://lcsc.com/product-detail/Multilayer-Ceramic-Capacitors-MLCC---SMD-SMT_Kyocera-AVX-Kyocera-AVX-0603YC104KAT2A_C130268.html
footprint CAP-0603 (0603 (1608M) Capacitor)
pins: 1, 2

## 0603YC105KAT2A
designator C?  Capacitance: 1uF  (hidden comment: *)
Capacitor, Ceramic (MLCC), 1uF, ±10%, 16V, X7R, ±10%, SMD 0603; Manufacturer: Kyocera AVX; Manufacturer Part Number: 0603YC105KAT2A; Package Size: 0603; JLCPCB Basic Part: No; JLCPCB Part Number: C4153100; Supplier 1: LCSC; Category: Capacitors - MLCC; Supplier Part Number 1: C4153100; Tolerance: ±10%; Voltage Rating: 16V; Temperature Coefficient: X7R; RoHS: Yes; ComponentLink1Description: Datasheet; ComponentLink1URL: https://wmsc.lcsc.com/wmsc/upload/file/pdf/v2/lcsc/2207111801_Kyocera-AVX-0603YC105KAT2A_C4153100.pdf; ComponentLink2Description: JLCPCB Part URL; ComponentLink2URL: https://jlcpcb.com/partdetail/C4153100; ComponentLink3Description: LCSC Part URL; ComponentLink3URL: https://lcsc.com/product-detail/Multilayer-Ceramic-Capacitors-MLCC---SMD-SMT_Kyocera-AVX-Kyocera-AVX-0603YC105KAT2A_C4153100.html
footprint CAP-0603 (0603 (1608M) Capacitor)
pins: 1, 2

## 0603YC330JAT2A
designator C?  Capacitance: 33pF  (hidden comment: *)
Capacitor, Ceramic (MLCC), 33pF, ±5%, 16V, X7R, ±5%, SMD 0603; Manufacturer: Kyocera AVX; Manufacturer Part Number: 0603YC330JAT2A; Package Size: 0603; JLCPCB Basic Part: No; JLCPCB Part Number: C2169365; Supplier 1: LCSC; Category: Capacitors - MLCC; Supplier Part Number 1: C2169365; Tolerance: ±5%; Voltage Rating: 16V; Temperature Coefficient: X7R; RoHS: Yes; ComponentLink1Description: Datasheet; ComponentLink1URL: https://wmsc.lcsc.com/wmsc/upload/file/pdf/v2/lcsc/2304140030_Kyocera-AVX-0603YC330JAT2A_C2169365.pdf; ComponentLink2Description: JLCPCB Part URL; ComponentLink2URL: https://jlcpcb.com/partdetail/C2169365; ComponentLink3Description: LCSC Part URL; ComponentLink3URL: https://lcsc.com/product-detail/Multilayer-Ceramic-Capacitors-MLCC---SMD-SMT_Kyocera-AVX-Kyocera-AVX-0603YC330JAT2A_C2169365.html
footprint CAP-0603 (0603 (1608M) Capacitor)
pins: 1, 2

## 0603YD105KAT2A
designator C?  Capacitance: 1uF  (hidden comment: *)
Capacitor, Ceramic (MLCC), 1uF, ±10%, 16V, X5R, ±10%, SMD 0603; Manufacturer: AVX; Manufacturer Part Number: 0603YD105KAT2A; Package Size: 0603; JLCPCB Basic Part: No; JLCPCB Part Number: C597247; Supplier 1: LCSC; Category: Capacitors - MLCC; Supplier Part Number 1: C597247; Tolerance: ±10%; Voltage Rating: 16V; Temperature Coefficient: X5R; RoHS: Yes; ComponentLink1Description: Datasheet; ComponentLink1URL: https://wmsc.lcsc.com/wmsc/upload/file/pdf/v2/lcsc/2304140030_Kyocera-AVX-0603YD105KAT2A_C597247.pdf; ComponentLink2Description: JLCPCB Part URL; ComponentLink2URL: https://jlcpcb.com/partdetail/C597247; ComponentLink3Description: LCSC Part URL; ComponentLink3URL: https://lcsc.com/product-detail/Multilayer-Ceramic-Capacitors-MLCC---SMD-SMT_Kyocera-AVX-Kyocera-AVX-0603YD105KAT2A_C597247.html
footprint CAP-0603 (0603 (1608M) Capacitor)
pins: 1, 2

## 0603ZC103KAT2A
designator C?  Capacitance: 10nF  (hidden comment: *)
Capacitor, Ceramic (MLCC), 10nF, ±10%, 10V, X7R, ±10%, SMD 0603; Manufacturer: Kyocera AVX; Manufacturer Part Number: 0603ZC103KAT2A; Package Size: 0603; JLCPCB Basic Part: No; JLCPCB Part Number: C2169647; Supplier 1: LCSC; Category: Capacitors - MLCC; Supplier Part Number 1: C2169647; Tolerance: ±10%; Voltage Rating: 10V; Temperature Coefficient: X7R; RoHS: Yes; ComponentLink1Description: Datasheet; ComponentLink1URL: https://wmsc.lcsc.com/wmsc/upload/file/pdf/v2/lcsc/2304140030_Kyocera-AVX-0603ZC103KAT2A_C2169647.pdf; ComponentLink2Description: JLCPCB Part URL; ComponentLink2URL: https://jlcpcb.com/partdetail/C2169647; ComponentLink3Description: LCSC Part URL; ComponentLink3URL: https://lcsc.com/product-detail/Multilayer-Ceramic-Capacitors-MLCC---SMD-SMT_Kyocera-AVX-Kyocera-AVX-0603ZC103KAT2A_C2169647.html
footprint CAP-0603 (0603 (1608M) Capacitor)
pins: 1, 2
